# Altium footprint library NDLib.PCBLIB: 499 footprints (part 21 of 32)
Each footprint in its own frame and in the unit in brackets; x right, y up, seen from the top. Pads: shape width x height; smd on the part's side, far side on the other; paste and mask are expansions set on the pad; w line width, h text height; cw(c..) or ccw(c..) is an arc to the next point about the centre after c.
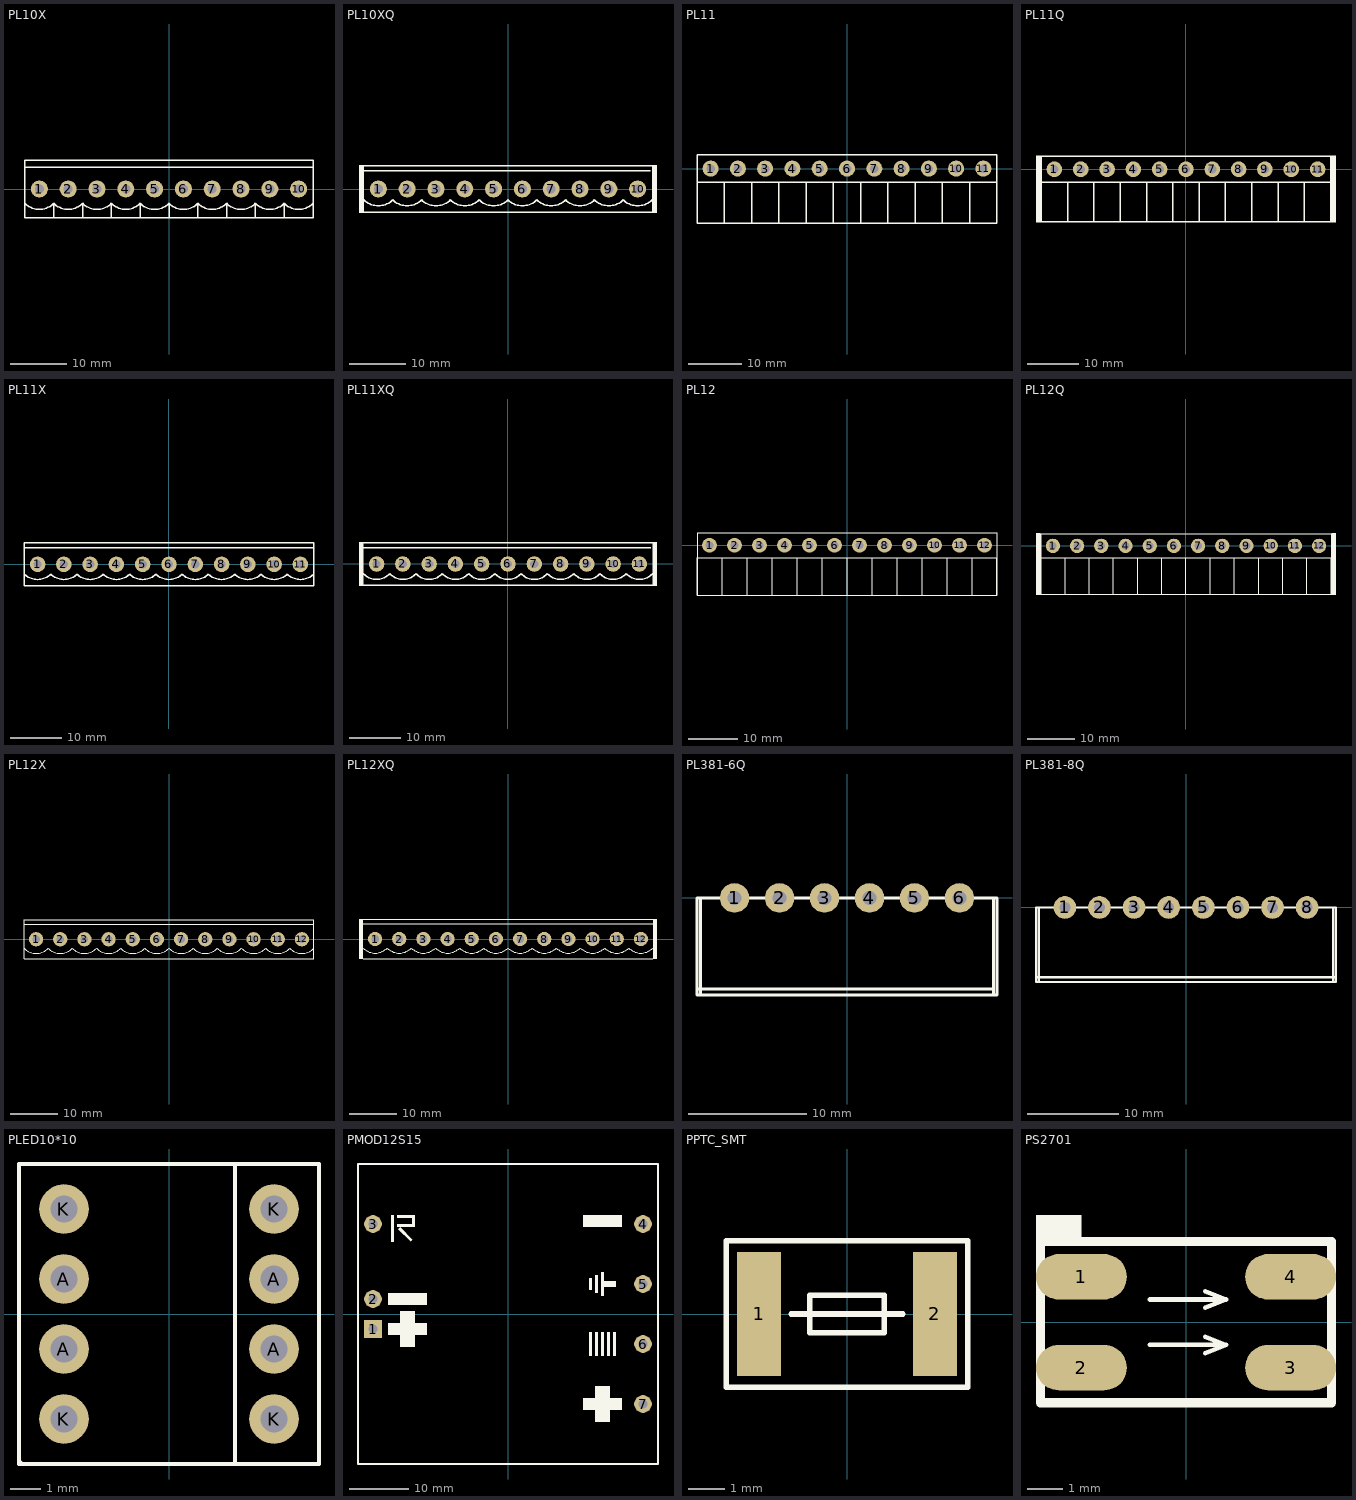
[diagram p20: the footprints below, top view; thin cyan lines are the x and y axes]

## PL10X [mm]
pads (10):
  round 3 hole 1.6: 1(-22.86,0) 2(-17.78,0) 3(-12.7,0) 4(-7.62,0) 5(-2.54,0) 6(2.54,0) 7(7.62,0) 8(12.7,0) 9(17.78,0) 10(22.86,0)
TopOverlay:
  lines w0.254: -25.4,-2.54 ccw(c-22.86,0) -20.32,-2.54 ; -20.32,-5.08 -20.32,-2.54 ; -15.24,-5.08 -15.24,-2.54 ; -5.08,-5.08 -5.08,-2.54 ; 0,-5.08 0,-2.54 ; 10.16,3.81 25.4,3.81 ; 10.16,5.08 25.4,5.08 25.4,-5.08 ; 20.32,3.81 5.08,3.81 -25.4,3.81 ; 20.32,5.08 5.08,5.08 -25.4,5.08 -25.4,3.81 ; -25.4,3.81 -25.4,-5.08 -10.16,-5.08 ; -20.32,-2.54 ccw(c-17.78,0) -15.24,-2.54 ; -15.24,-2.54 ccw(c-12.7,0) -10.16,-2.54 ; -10.16,-5.08 -10.16,-2.54 ; -10.16,-5.08 5.08,-5.08 ; -10.16,-2.54 ccw(c-7.62,0) -5.08,-2.54 ; -5.08,-2.54 ccw(c-2.54,0) 0,-2.54 ; 0,-2.54 ccw(c2.54,0) 5.08,-2.54 ; 5.08,-5.08 5.08,-2.54 ; 5.08,-5.08 20.32,-5.08 ; 5.08,-2.54 ccw(c7.62,0) 10.16,-2.54 ; 10.16,-2.54 ccw(c12.7,0) 15.24,-2.54 ; 10.16,-2.54 ccw(c12.7,0) 15.24,-2.54 ; 10.16,-2.54 10.16,-5.08 25.4,-5.08 ; 15.24,-2.54 ccw(c17.78,0) 20.32,-2.54 ; 15.24,-2.54 ccw(c17.78,0) 20.32,-2.54 ; 15.24,-2.54 15.24,-5.08 15.24,-2.54 ; 20.32,-5.08 20.32,-2.54 ; 20.32,-5.08 20.32,-2.54 ; 20.32,-2.54 ccw(c22.86,0) 25.4,-2.54 25.4,-5.08

## PL10XQ [mm]
pads (10):
  round 3 hole 1.6: 1(-22.86,0) 2(-17.78,0) 3(-12.7,0) 4(-7.62,0) 5(-2.54,0) 6(2.54,0) 7(7.62,0) 8(12.7,0) 9(17.78,0) 10(22.86,0)
TopOverlay:
  region: -25.4,4.255 -26.27,4.255 -26.27,-4.255 -25.4,-4.255
  rectangle: 25.4,-4.255 26.27,4.255
  lines w0.254: -25.4,-4.127 -15.24,-4.127 -10.16,-4.127 -5.08,-4.127 0,-4.127 5.08,-4.127 10.16,-4.127 15.24,-4.127 20.32,-4.127 25.4,-4.127 ; -25.4,-1.905 ccw(c-22.86,0.635) -20.32,-1.905 ccw(c-17.78,0.635) -15.24,-1.905 ccw(c-12.7,0.635) -10.16,-1.905 ccw(c-7.62,0.635) -5.08,-1.905 ccw(c-2.54,0.635) 0,-1.905 ccw(c2.54,0.635) 5.08,-1.905 ccw(c7.62,0.635) 10.16,-1.905 ccw(c12.7,0.635) 15.24,-1.905 ccw(c17.78,0.635) 20.32,-1.905 ccw(c22.86,0.635) 25.4,-1.905 ; -25.4,3.175 -15.24,3.175 -10.477,3.175 -10.16,3.175 -5.397,3.175 ; -25.4,4.127 -15.24,4.127 -10.16,4.127 -5.08,4.127 0,4.127 5.08,4.127 10.16,4.127 15.24,4.127 20.32,4.127 25.4,4.127 ; 25.082,3.175 20.32,3.175 ; -5.397,3.175 -5.08,3.175 ; -5.397,3.175 -5.08,3.175 ; -5.08,3.175 -0.318,3.175 ; -0.318,3.175 0,3.175 ; -0.318,3.175 0,3.175 ; -0.318,3.175 0,3.175 ; 0,3.175 4.763,3.175 ; 4.763,3.175 5.08,3.175 ; 4.763,3.175 5.08,3.175 ; 4.763,3.175 5.08,3.175 ; 4.763,3.175 5.08,3.175 ; 5.08,3.175 9.842,3.175 ; 9.842,3.175 10.16,3.175 ; 9.842,3.175 10.16,3.175 ; 9.842,3.175 10.16,3.175 ; 9.842,3.175 10.16,3.175 ; 9.842,3.175 10.16,3.175 ; 10.16,3.175 14.922,3.175 ; 14.922,3.175 15.24,3.175 ; 14.922,3.175 15.24,3.175 ; 14.922,3.175 15.24,3.175 ; 14.922,3.175 15.24,3.175 ; 14.922,3.175 15.24,3.175 ; 15.24,3.175 20.002,3.175 ; 20.002,3.175 20.32,3.175 ; 20.002,3.175 20.32,3.175 ; 20.002,3.175 20.32,3.175 ; 20.002,3.175 20.32,3.175 ; 20.002,3.175 20.32,3.175

## PL11 [mm]
pads (11):
  round 3 hole 1.6: 1(-25.4,0) 2(-20.32,0) 3(-15.24,0) 4(-10.16,0) 5(-5.08,0) 6(0,0) 7(5.08,0) 8(10.16,0) 9(15.24,0) 10(20.32,0) 11(25.4,0)
TopOverlay:
  lines w0.254: -22.86,-10.16 -22.86,-2.54 ; -17.78,-10.16 -17.78,-2.54 ; -12.7,-10.16 -12.7,-2.54 ; -7.62,-10.16 -7.62,-2.54 ; -2.54,-10.16 -2.54,-2.54 ; 2.54,-10.16 2.54,-2.54 ; 7.62,-10.16 7.62,-2.54 ; 12.7,-10.16 12.7,-2.54 ; 17.78,-10.16 17.78,-2.54 ; 22.86,-10.16 22.86,-2.54 ; 27.94,-5.08 27.94,2.54 -27.94,2.54 -27.94,-10.16 ; -27.94,-10.16 -27.94,-2.54 27.94,-2.54 27.94,-10.16 -27.94,-10.16

## PL11Q [mm]
pads (11):
  round 3 hole 1.6: 1(-25.4,0) 2(-20.32,0) 3(-15.24,0) 4(-10.16,0) 5(-5.08,0) 6(0,0) 7(5.08,0) 8(10.16,0) 9(15.24,0) 10(20.32,0) 11(25.4,0)
TopOverlay:
  rectangle: 27.991,-10.287 28.956,2.667
  region: -27.991,2.667 -28.956,2.667 -28.956,-10.287 -27.991,-10.287
  lines w0.254: -22.86,-10.16 -22.86,-2.54 ; -17.78,-10.16 -17.78,-2.54 ; -12.7,-10.16 -12.7,-2.54 ; -7.62,-10.16 -7.62,-2.54 ; -2.54,-10.16 -2.54,-2.54 ; 2.54,-10.16 2.54,-2.54 ; 7.62,-10.16 7.62,-2.54 ; 12.7,-10.16 12.7,-2.54 ; 17.78,-10.16 17.78,-2.54 ; 22.86,-10.16 22.86,-2.54 ; 27.94,-5.08 27.94,2.54 -27.94,2.54 -27.94,-10.16 ; -27.94,-10.16 27.94,-10.16 27.94,-2.54 -27.94,-2.54 -27.94,-10.16

## PL11X [mm]
pads (11):
  round 3 hole 1.6: 1(-25.4,0) 2(-20.32,0) 3(-15.24,0) 4(-10.16,0) 5(-5.08,0) 6(0,0) 7(5.08,0) 8(10.16,0) 9(15.24,0) 10(20.32,0) 11(25.4,0)
TopOverlay:
  lines w0.254: -27.94,-1.905 ccw(c-25.4,0.635) -22.86,-1.905 ccw(c-20.32,0.635) -17.78,-1.905 ccw(c-15.24,0.635) -12.7,-1.905 ccw(c-10.16,0.635) -7.62,-1.905 ccw(c-5.08,0.635) -2.54,-1.905 ccw(c0,0.635) 2.54,-1.905 ccw(c5.08,0.635) 7.62,-1.905 ccw(c10.16,0.635) 12.7,-1.905 ccw(c15.24,0.635) 17.78,-1.905 ccw(c20.32,0.635) 22.86,-1.905 ccw(c25.4,0.635) 27.94,-1.905 ; -27.94,3.175 -17.78,3.175 -13.018,3.175 -12.7,3.175 -7.938,3.175 ; 27.94,3.175 27.622,3.175 22.86,3.175 ; -7.938,3.175 -7.62,3.175 ; -7.938,3.175 -7.62,3.175 ; -7.62,3.175 -2.857,3.175 ; -2.857,3.175 -2.54,3.175 ; -2.857,3.175 -2.54,3.175 ; -2.857,3.175 -2.54,3.175 ; -2.54,3.175 2.222,3.175 ; 2.222,3.175 2.54,3.175 ; 2.222,3.175 2.54,3.175 ; 2.222,3.175 2.54,3.175 ; 2.222,3.175 2.54,3.175 ; 2.54,3.175 7.302,3.175 ; 7.302,3.175 7.62,3.175 ; 7.302,3.175 7.62,3.175 ; 7.302,3.175 7.62,3.175 ; 7.302,3.175 7.62,3.175 ; 7.302,3.175 7.62,3.175 ; 7.62,3.175 12.383,3.175 ; 12.383,3.175 12.7,3.175 ; 12.383,3.175 12.7,3.175 ; 12.383,3.175 12.7,3.175 ; 12.383,3.175 12.7,3.175 ; 12.383,3.175 12.7,3.175 ; 12.7,3.175 17.462,3.175 ; 17.462,3.175 17.78,3.175 ; 17.462,3.175 17.78,3.175 ; 17.462,3.175 17.78,3.175 ; 17.462,3.175 17.78,3.175 ; 17.462,3.175 17.78,3.175 ; 17.78,3.175 22.543,3.175 ; 22.543,3.175 22.86,3.175 ; 22.543,3.175 22.86,3.175 ; 22.543,3.175 22.86,3.175 ; 22.543,3.175 22.86,3.175 ; 22.543,3.175 22.86,3.175 ; -27.94,-4.127 -27.94,4.127 -17.78,4.127 -12.7,4.127 -7.62,4.127 -2.54,4.127 2.54,4.127 7.62,4.127 12.7,4.127 17.78,4.127 22.86,4.127 27.94,4.127 27.94,-4.127 22.86,-4.127 17.78,-4.127 12.7,-4.127 7.62,-4.127 2.54,-4.127 -2.54,-4.127 -7.62,-4.127 -12.7,-4.127 -17.78,-4.127 -27.94,-4.127

## PL11XQ [mm]
pads (11):
  round 3 hole 1.6: 1(-25.4,0) 2(-20.32,0) 3(-15.24,0) 4(-10.16,0) 5(-5.08,0) 6(0,0) 7(5.08,0) 8(10.16,0) 9(15.24,0) 10(20.32,0) 11(25.4,0)
TopOverlay:
  rectangle: 27.94,-4.255 28.81,4.255
  region: -27.94,4.255 -28.81,4.255 -28.81,-4.255 -27.94,-4.255
  lines w0.254: -27.94,-4.127 -17.78,-4.127 -12.7,-4.127 -7.62,-4.127 -2.54,-4.127 2.54,-4.127 7.62,-4.127 12.7,-4.127 17.78,-4.127 22.86,-4.127 27.94,-4.127 ; -27.94,-1.905 ccw(c-25.4,0.635) -22.86,-1.905 ccw(c-20.32,0.635) -17.78,-1.905 ccw(c-15.24,0.635) -12.7,-1.905 ccw(c-10.16,0.635) -7.62,-1.905 ccw(c-5.08,0.635) -2.54,-1.905 ccw(c0,0.635) 2.54,-1.905 ccw(c5.08,0.635) 7.62,-1.905 ccw(c10.16,0.635) 12.7,-1.905 ccw(c15.24,0.635) 17.78,-1.905 ccw(c20.32,0.635) 22.86,-1.905 ccw(c25.4,0.635) 27.94,-1.905 ; -27.94,3.175 -17.78,3.175 -13.018,3.175 -12.7,3.175 -7.938,3.175 ; -27.94,4.127 -17.78,4.127 -12.7,4.127 -7.62,4.127 -2.54,4.127 2.54,4.127 7.62,4.127 12.7,4.127 17.78,4.127 22.86,4.127 27.94,4.127 ; 27.622,3.175 22.86,3.175 ; -7.938,3.175 -7.62,3.175 ; -7.938,3.175 -7.62,3.175 ; -7.62,3.175 -2.857,3.175 ; -2.857,3.175 -2.54,3.175 ; -2.857,3.175 -2.54,3.175 ; -2.857,3.175 -2.54,3.175 ; -2.54,3.175 2.222,3.175 ; 2.222,3.175 2.54,3.175 ; 2.222,3.175 2.54,3.175 ; 2.222,3.175 2.54,3.175 ; 2.222,3.175 2.54,3.175 ; 2.54,3.175 7.302,3.175 ; 7.302,3.175 7.62,3.175 ; 7.302,3.175 7.62,3.175 ; 7.302,3.175 7.62,3.175 ; 7.302,3.175 7.62,3.175 ; 7.302,3.175 7.62,3.175 ; 7.62,3.175 12.383,3.175 ; 12.383,3.175 12.7,3.175 ; 12.383,3.175 12.7,3.175 ; 12.383,3.175 12.7,3.175 ; 12.383,3.175 12.7,3.175 ; 12.383,3.175 12.7,3.175 ; 12.7,3.175 17.462,3.175 ; 17.462,3.175 17.78,3.175 ; 17.462,3.175 17.78,3.175 ; 17.462,3.175 17.78,3.175 ; 17.462,3.175 17.78,3.175 ; 17.462,3.175 17.78,3.175 ; 17.78,3.175 22.543,3.175 ; 22.543,3.175 22.86,3.175 ; 22.543,3.175 22.86,3.175 ; 22.543,3.175 22.86,3.175 ; 22.543,3.175 22.86,3.175 ; 22.543,3.175 22.86,3.175

## PL12 [mm]
pads (12):
  round 3 hole 1.6: 1(-27.94,0) 2(-22.86,0) 3(-17.78,0) 4(-12.7,0) 5(-7.62,0) 6(-2.54,0) 7(2.54,0) 8(7.62,0) 9(12.7,0) 10(17.78,0) 11(22.86,0) 12(27.94,0)
TopOverlay:
  lines w0.254: -25.4,-10.16 -25.4,-2.54 ; -20.32,-10.16 -20.32,-2.54 ; -15.24,-10.16 -15.24,-2.54 ; -10.16,-10.16 -10.16,-2.54 ; -5.08,-10.16 -5.08,-2.54 ; 0,-10.16 0,-2.54 ; 5.08,-10.16 5.08,-2.54 ; 10.16,-10.16 10.16,-2.54 ; 15.24,-10.16 15.24,-2.54 ; 20.32,-10.16 20.32,-2.54 ; 25.4,-10.16 25.4,-2.54 ; -30.48,-10.16 -30.48,-2.54 30.48,-2.54 ; -30.48,-10.16 -30.48,2.54 30.48,2.54 30.48,-10.16 ; -30.48,-10.16 30.48,-10.16 ; 30.48,-10.16 30.48,-2.54 ; 30.48,-10.16 30.48,-2.54

## PL12Q [mm]
pads (12):
  round 3 hole 1.6: 1(-27.94,0) 2(-22.86,0) 3(-17.78,0) 4(-12.7,0) 5(-7.62,0) 6(-2.54,0) 7(2.54,0) 8(7.62,0) 9(12.7,0) 10(17.78,0) 11(22.86,0) 12(27.94,0)
TopOverlay:
  region: -30.531,2.667 -31.496,2.667 -31.496,-10.287 -30.531,-10.287
  rectangle: 30.531,-10.287 31.496,2.667
  lines w0.254: -25.4,-10.16 -25.4,-2.54 ; -20.32,-10.16 -20.32,-2.54 ; -15.24,-10.16 -15.24,-2.54 ; -10.16,-10.16 -10.16,-2.54 ; -5.08,-10.16 -5.08,-2.54 ; 0,-10.16 0,-2.54 ; 5.08,-10.16 5.08,-2.54 ; 10.16,-10.16 10.16,-2.54 ; 15.24,-10.16 15.24,-2.54 ; 20.32,-10.16 20.32,-2.54 ; 25.4,-10.16 25.4,-2.54 ; -30.48,-10.16 30.48,-10.16 ; -30.48,-10.16 -30.48,2.54 30.48,2.54 30.48,-10.16 ; -30.48,-10.16 -30.48,-2.54 30.48,-2.54 ; 30.48,-10.16 30.48,-2.54 ; 30.48,-10.16 30.48,-2.54

## PL12X [mm]
pads (12):
  round 3 hole 1.6: 1(-27.94,0) 2(-22.86,0) 3(-17.78,0) 4(-12.7,0) 5(-7.62,0) 6(-2.54,0) 7(2.54,0) 8(7.62,0) 9(12.7,0) 10(17.78,0) 11(22.86,0) 12(27.94,0)
TopOverlay:
  lines w0.254: -30.48,-1.905 ccw(c-27.94,0.635) -25.4,-1.905 ccw(c-22.86,0.635) -20.32,-1.905 ccw(c-17.78,0.635) -15.24,-1.905 ccw(c-12.7,0.635) -10.16,-1.905 ccw(c-7.62,0.635) -5.08,-1.905 ccw(c-2.54,0.635) 0,-1.905 ccw(c2.54,0.635) 5.08,-1.905 ccw(c7.62,0.635) 10.16,-1.905 ccw(c12.7,0.635) 15.24,-1.905 ccw(c17.78,0.635) 20.32,-1.905 ccw(c22.86,0.635) 25.4,-1.905 ccw(c27.94,0.635) 30.48,-1.905 ; -30.48,3.175 -20.32,3.175 -15.557,3.175 -15.24,3.175 -10.477,3.175 ; 30.48,3.175 30.162,3.175 25.4,3.175 ; -10.477,3.175 -10.16,3.175 ; -10.477,3.175 -10.16,3.175 ; -10.16,3.175 -5.397,3.175 ; -5.397,3.175 -5.08,3.175 ; -5.397,3.175 -5.08,3.175 ; -5.397,3.175 -5.08,3.175 ; -5.08,3.175 -0.318,3.175 ; -0.318,3.175 0,3.175 ; -0.318,3.175 0,3.175 ; -0.318,3.175 0,3.175 ; -0.318,3.175 0,3.175 ; 0,3.175 4.763,3.175 ; 4.763,3.175 5.08,3.175 ; 4.763,3.175 5.08,3.175 ; 4.763,3.175 5.08,3.175 ; 4.763,3.175 5.08,3.175 ; 4.763,3.175 5.08,3.175 ; 5.08,3.175 9.842,3.175 ; 9.842,3.175 10.16,3.175 ; 9.842,3.175 10.16,3.175 ; 9.842,3.175 10.16,3.175 ; 9.842,3.175 10.16,3.175 ; 9.842,3.175 10.16,3.175 ; 10.16,3.175 14.922,3.175 ; 14.922,3.175 15.24,3.175 ; 14.922,3.175 15.24,3.175 ; 14.922,3.175 15.24,3.175 ; 14.922,3.175 15.24,3.175 ; 14.922,3.175 15.24,3.175 ; 15.24,3.175 20.002,3.175 ; 20.002,3.175 20.32,3.175 ; 20.002,3.175 20.32,3.175 ; 20.002,3.175 20.32,3.175 ; 20.002,3.175 20.32,3.175 ; 20.002,3.175 20.32,3.175 ; 20.32,3.175 25.082,3.175 ; 25.082,3.175 25.4,3.175 ; 25.082,3.175 25.4,3.175 ; 25.082,3.175 25.4,3.175 ; 25.082,3.175 25.4,3.175 ; 25.082,3.175 25.4,3.175 ; -30.48,-4.127 -20.32,-4.127 -15.24,-4.127 -10.16,-4.127 -5.08,-4.127 0,-4.127 5.08,-4.127 10.16,-4.127 15.24,-4.127 20.32,-4.127 25.4,-4.127 30.48,-4.127 30.48,4.127 25.4,4.127 20.32,4.127 15.24,4.127 10.16,4.127 5.08,4.127 0,4.127 -5.08,4.127 -10.16,4.127 -15.24,4.127 -20.32,4.127 -30.48,4.127 -30.48,-4.127

## PL12XQ [mm]
pads (12):
  round 3 hole 1.6: 1(-27.94,0) 2(-22.86,0) 3(-17.78,0) 4(-12.7,0) 5(-7.62,0) 6(-2.54,0) 7(2.54,0) 8(7.62,0) 9(12.7,0) 10(17.78,0) 11(22.86,0) 12(27.94,0)
TopOverlay:
  region: -30.48,4.255 -31.35,4.255 -31.35,-4.255 -30.48,-4.255
  rectangle: 30.48,-4.255 31.35,4.255
  lines w0.254: -30.48,-4.127 -20.32,-4.127 -15.24,-4.127 -10.16,-4.127 -5.08,-4.127 0,-4.127 5.08,-4.127 10.16,-4.127 15.24,-4.127 20.32,-4.127 25.4,-4.127 30.48,-4.127 ; -30.48,-1.905 ccw(c-27.94,0.635) -25.4,-1.905 ccw(c-22.86,0.635) -20.32,-1.905 ccw(c-17.78,0.635) -15.24,-1.905 ccw(c-12.7,0.635) -10.16,-1.905 ccw(c-7.62,0.635) -5.08,-1.905 ccw(c-2.54,0.635) 0,-1.905 ccw(c2.54,0.635) 5.08,-1.905 ccw(c7.62,0.635) 10.16,-1.905 ccw(c12.7,0.635) 15.24,-1.905 ccw(c17.78,0.635) 20.32,-1.905 ccw(c22.86,0.635) 25.4,-1.905 ccw(c27.94,0.635) 30.48,-1.905 ; -30.48,3.175 -20.32,3.175 -15.557,3.175 -15.24,3.175 -10.477,3.175 ; -30.48,4.127 -20.32,4.127 -15.24,4.127 -10.16,4.127 -5.08,4.127 0,4.127 5.08,4.127 10.16,4.127 15.24,4.127 20.32,4.127 25.4,4.127 30.48,4.127 ; 31.115,3.175 25.4,3.175 ; -10.477,3.175 -10.16,3.175 ; -10.477,3.175 -10.16,3.175 ; -10.16,3.175 -5.397,3.175 ; -5.397,3.175 -5.08,3.175 ; -5.397,3.175 -5.08,3.175 ; -5.397,3.175 -5.08,3.175 ; -5.08,3.175 -0.318,3.175 ; -0.318,3.175 0,3.175 ; -0.318,3.175 0,3.175 ; -0.318,3.175 0,3.175 ; -0.318,3.175 0,3.175 ; 0,3.175 4.763,3.175 ; 4.763,3.175 5.08,3.175 ; 4.763,3.175 5.08,3.175 ; 4.763,3.175 5.08,3.175 ; 4.763,3.175 5.08,3.175 ; 4.763,3.175 5.08,3.175 ; 5.08,3.175 9.842,3.175 ; 9.842,3.175 10.16,3.175 ; 9.842,3.175 10.16,3.175 ; 9.842,3.175 10.16,3.175 ; 9.842,3.175 10.16,3.175 ; 9.842,3.175 10.16,3.175 ; 10.16,3.175 14.922,3.175 ; 14.922,3.175 15.24,3.175 ; 14.922,3.175 15.24,3.175 ; 14.922,3.175 15.24,3.175 ; 14.922,3.175 15.24,3.175 ; 14.922,3.175 15.24,3.175 ; 15.24,3.175 20.002,3.175 ; 20.002,3.175 20.32,3.175 ; 20.002,3.175 20.32,3.175 ; 20.002,3.175 20.32,3.175 ; 20.002,3.175 20.32,3.175 ; 20.002,3.175 20.32,3.175 ; 20.32,3.175 25.082,3.175 ; 25.082,3.175 25.4,3.175 ; 25.082,3.175 25.4,3.175 ; 25.082,3.175 25.4,3.175 ; 25.082,3.175 25.4,3.175 ; 25.082,3.175 25.4,3.175

## PL381-6Q [mm]
pads (6):
  round 2.5 hole 1.2: 1(-9.525,0) 2(-5.715,0) 3(-1.905,0) 4(1.905,0) 5(5.715,0) 6(9.525,0)
TopOverlay:
  lines w0.254: -12.705,-7.692 12.405,-7.692 ; -12.705,-8.2 -12.705,0 ; -12.705,-8.2 -12.405,-8.2 -12.405,0 -12.705,0 ; -12.705,-8.2 12.405,-8.2 ; -12.705,0 0,0 12.705,0 ; 12.405,-8.2 12.405,0 12.705,0 ; 12.405,-8.2 12.705,-8.2 12.705,0

## PL381-8Q [mm]
pads (8):
  round 2.5 hole 1.2: 1(-13.335,0) 2(-9.525,0) 3(-5.715,0) 4(-1.905,0) 5(1.905,0) 6(5.715,0) 7(9.525,0) 8(13.335,0)
TopOverlay:
  lines w0.254: -16.515,-7.692 16.515,-7.692 ; -16.515,-8.2 16.515,-8.2 ; -16.515,-8.2 -16.215,-8.2 -16.215,0 -16.515,0 ; -16.515,-8.2 -16.515,0 ; -16.515,0 0,0 16.515,0 ; 16.515,-8.2 16.515,0 ; 16.515,-8.2 16.215,-8.2 16.215,0 16.515,0

## PLED10*10 [mil]
pads (8):
  round 65 hole 36: A(-137.8,-45.93) A(-137.8,45.93) A(137.8,-45.93) A(137.8,45.93) K(-137.8,-137.8) K(-137.8,137.79) K(137.8,-137.8) K(137.8,137.79)
TopOverlay:
  lines w5: -196.85,-196.85 196.85,-196.85 ; -194.88,-194.88 -196.85,-194.88 -196.85,196.85 196.85,196.85 ; 86.61,-196.85 86.61,196.85 ; 196.85,-196.85 196.85,196.85 ; 196.85,-196.85 196.85,196.85

## PMOD12S15 [mm]
height 10
pads (7):
  rect 3x3 hole 1.5: 1(-22.86,-2.54)
  round 3 hole 1.5: 2(-22.86,2.54) 3(-22.86,15.24) 4(22.86,15.24) 5(22.86,5.08) 6(22.86,-5.08) 7(22.86,-15.24)
TopOverlay:
  rectangle: -20.32,-3.556 -13.716,-1.524
  rectangle: -18.288,-5.588 -15.748,0.508
  rectangle: -20.32,1.524 -13.716,3.556
  rectangle: -19.812,12.192 -19.304,16.764
  rectangle: -18.796,16.256 -15.748,16.764
  rectangle: -18.796,14.732 -15.748,15.24
  region: -15.748,14.732 -15.748,16.764 -16.256,16.764 -16.256,14.732
  region: -16.133,12.577 -18.288,14.732 -18.647,14.373 -16.492,12.218
  rectangle: 17.78,-7.112 18.288,-3.048
  rectangle: 16.764,-7.112 17.272,-3.048
  rectangle: 15.748,-7.112 16.256,-3.048
  rectangle: 14.732,-7.112 15.24,-3.048
  rectangle: 13.716,-7.112 14.224,-3.048
  rectangle: 12.7,-16.256 19.304,-14.224
  rectangle: 14.732,-18.288 17.272,-12.192
  rectangle: 12.7,14.732 19.304,16.764
  region: 18.288,5.08 16.256,5.08 16.256,4.572 18.288,4.572
  rectangle: 15.748,3.048 16.256,7.112
  region: 15.24,3.556 15.24,6.604 14.732,6.604 14.732,3.556
  region: 14.224,4.064 14.224,6.096 13.716,6.096 13.716,4.064
  region: 18.288,5.588 16.256,5.588 16.256,5.08 18.288,5.08
  lines w0.3: -25.4,-25.4 -25.4,25.4 25.4,25.4 25.4,-25.4 -25.4,-25.4
BottomOverlay:
  region: -13.716,3.556 -20.32,3.556 -20.32,1.524 -13.716,1.524
  region: -15.748,0.508 -18.288,0.508 -18.288,-5.588 -15.748,-5.588
  region: -13.716,-1.524 -20.32,-1.524 -20.32,-3.556 -13.716,-3.556
  region: -19.068,12.218 -16.913,14.373 -17.272,14.732 -19.427,12.577
  region: -19.304,14.732 -19.304,16.764 -19.812,16.764 -19.812,14.732
  region: -16.764,15.24 -19.812,15.24 -19.812,14.732 -16.764,14.732
  region: -16.764,16.764 -19.812,16.764 -19.812,16.256 -16.764,16.256
  region: -15.748,16.764 -16.256,16.764 -16.256,12.192 -15.748,12.192
  rectangle: 12.7,14.732 19.304,16.764
  rectangle: 14.732,-18.288 17.272,-12.192
  rectangle: 12.7,-16.256 19.304,-14.224
  rectangle: 13.716,-7.112 14.224,-3.048
  rectangle: 14.732,-7.112 15.24,-3.048
  rectangle: 15.748,-7.112 16.256,-3.048
  rectangle: 16.764,-7.112 17.272,-3.048
  rectangle: 17.78,-7.112 18.288,-3.048
  region: 18.288,5.08 16.256,5.08 16.256,4.572 18.288,4.572
  region: 13.716,6.096 13.716,4.064 14.224,4.064 14.224,6.096
  region: 14.732,6.604 14.732,3.556 15.24,3.556 15.24,6.604
  rectangle: 15.748,3.048 16.256,7.112
  region: 18.288,5.588 16.256,5.588 16.256,5.08 18.288,5.08

## PPTC_SMT [mm]
height 2
pads (2):
  rect 1.2x3.4 smd: 1(-2.4,0) 2(2.4,0)
TopOverlay:
  lines w0.152: -1.524,0 1.524,0 ; -1.016,-0.508 1.016,-0.508 1.016,0.508 -1.016,0.508 -1.016,-0.508
  lines w0.154: -3.302,-2 3.302,-2 3.302,2 -3.302,2 -3.302,-2
3D body: height 0.5, standoff 0, extent -2.363,-2.077 2.617,2.077

## PS2701 [mil]
pads (4):
  oval 100x50 smd: 1(-115,50) 2(-115,-50) 3(115,-50) 4(115,50)
TopOverlay:
  rectangle: -165,88.58 -115,118.11
  lines w5: -40,-25 44.08,-25 ; -40,25 44.08,25 ; 21.06,-34.14 44.08,-25 ; 21.06,-15.86 44.08,-25 ; 21.06,15.86 44.08,25 ; 21.06,34.14 44.08,25
  lines w10: -160,-88.58 -160,88.58 160,88.58 160,-88.58 -160,-88.58